# Altium footprint library 1.03-电容.PcbLib: 224 footprints (part 13 of 14)
Each footprint in its own frame and in the unit in brackets; x right, y up, seen from the top. Pads: shape width x height; smd on the part's side, far side on the other; paste and mask are expansions set on the pad; w line width, h text height; cw(c..) or ccw(c..) is an arc to the next point about the centre after c.
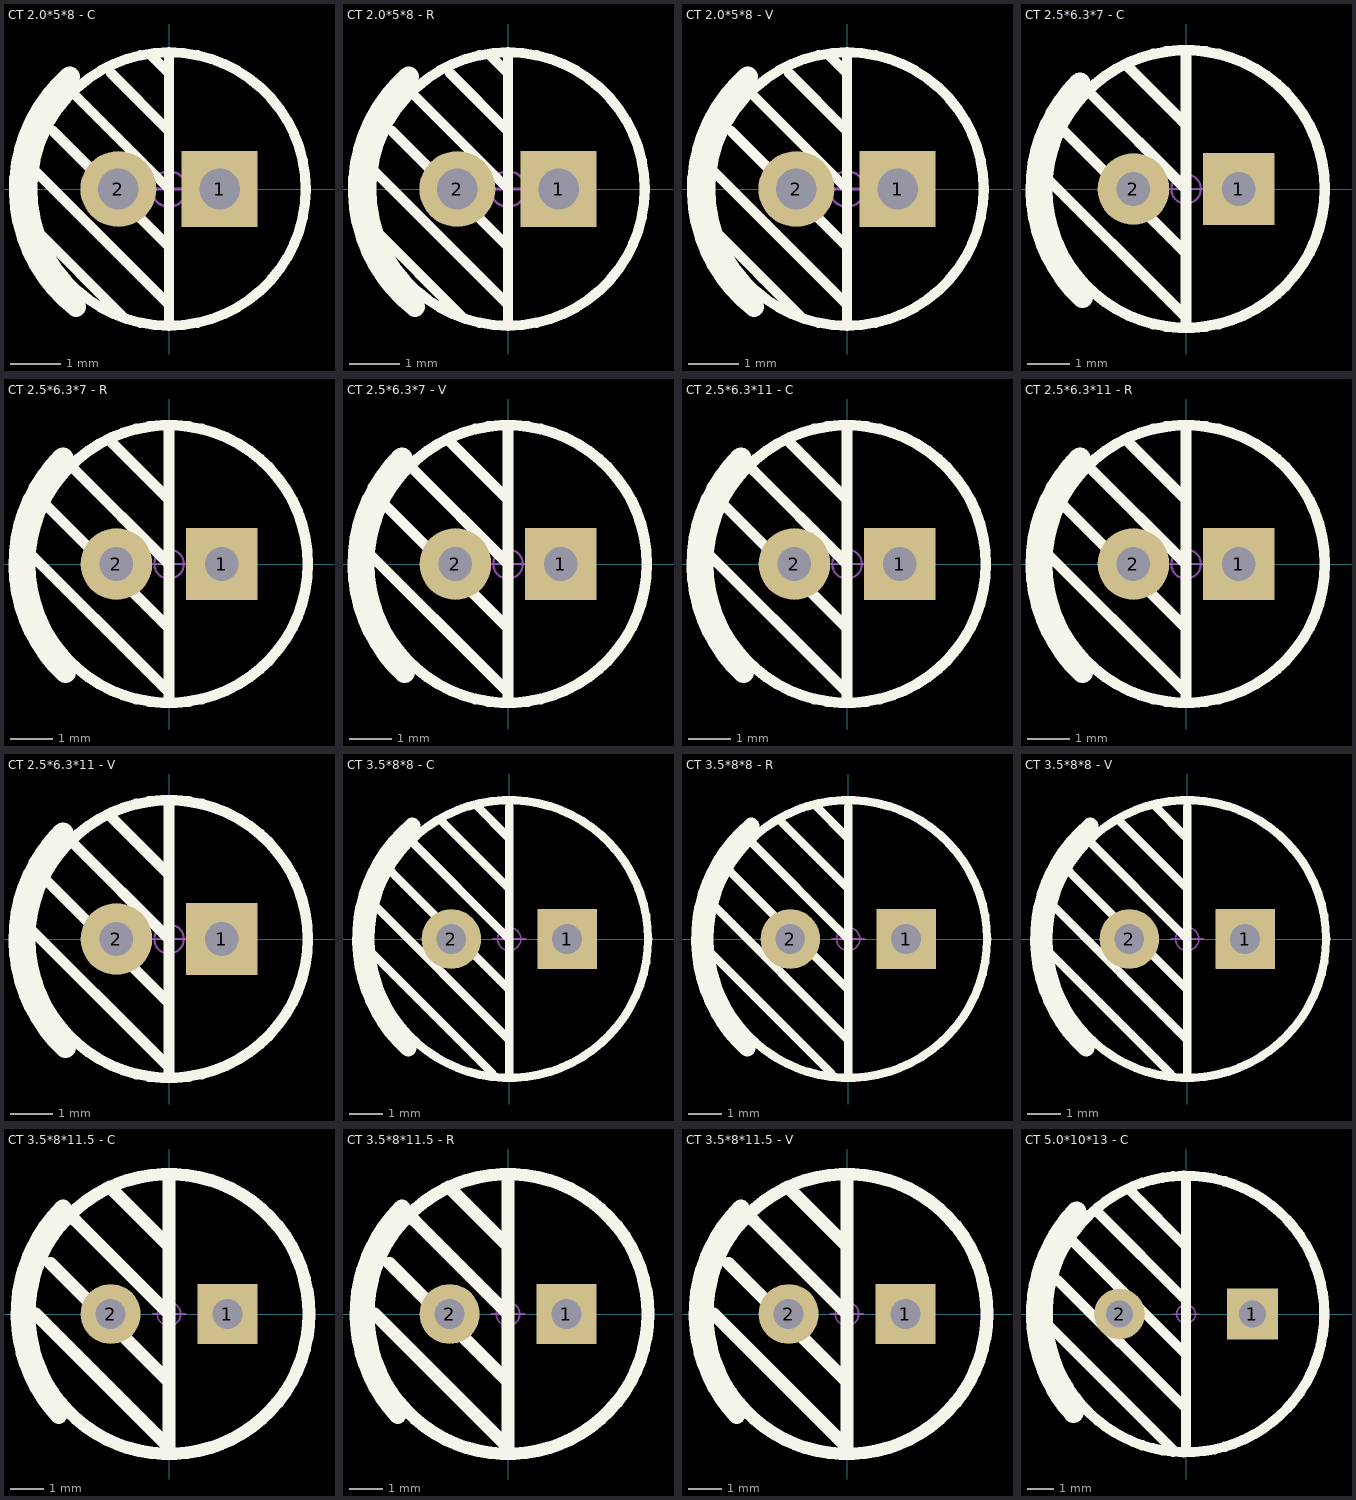
[diagram p12: the footprints below, top view; thin cyan lines are the x and y axes]

## CT 2.0*5*8 - C [mm] "脚距2mm , 直径5mm , 高8mm"
pads (2):
  rect 1.5x1.5 hole 0.8: 1(1,0)
  round 1.5 hole 0.8: 2(-1,0)
Top Overlay:
  circle w0.2: c0,0 r2.7
  lines w0.2: -2.667,-0.762 -0.889,-2.54 ; -2.667,0.381 0,-2.286 ; -2.286,1.143 0,-1.143 ; -1.905,1.905 0,0 ; -1.143,2.286 0,1.143 ; -0.381,2.667 0,2.286 ; 0,-2.667 0,2.667
  lines w0.4: -1.96,2.221 ccw(c0,0) -1.835,-2.325
Mechanical 15:
  circle w0.05: c0,0 r0.35
  lines w0.05: -0.5,0 0.5,0 ; 0,-0.5 0,0.5
3D body "CS_TH_5x8-B2.STEP": height 8.06, standoff -3.45, extent -2.5,-2.494 2.5,2.494

## CT 2.0*5*8 - R [mm] "脚距2mm , 直径5mm , 高8mm"
pads (2):
  rect 1.5x1.5 hole 0.8: 1(1,0)
  round 1.5 hole 0.8: 2(-1,0)
Top Overlay:
  circle w0.2: c0,0 r2.7
  lines w0.2: -2.667,-0.762 -0.889,-2.54 ; -2.667,0.381 0,-2.286 ; -2.286,1.143 0,-1.143 ; -1.905,1.905 0,0 ; -1.143,2.286 0,1.143 ; -0.381,2.667 0,2.286 ; 0,-2.667 0,2.667
  lines w0.4: -1.96,2.221 ccw(c0,0) -1.835,-2.325
Mechanical 15:
  circle w0.05: c0,0 r0.35
  lines w0.05: -0.5,0 0.5,0 ; 0,-0.5 0,0.5
3D body "CS_TH_5x8-R2.STEP": height 8.06, standoff -3.45, extent -2.5,-2.494 2.5,2.494

## CT 2.0*5*8 - V [mm] "脚距2mm , 直径5mm , 高8mm"
pads (2):
  rect 1.5x1.5 hole 0.8: 1(1,0)
  round 1.5 hole 0.8: 2(-1,0)
Top Overlay:
  circle w0.2: c0,0 r2.7
  lines w0.2: -2.667,-0.762 -0.889,-2.54 ; -2.667,0.381 0,-2.286 ; -2.286,1.143 0,-1.143 ; -1.905,1.905 0,0 ; -1.143,2.286 0,1.143 ; -0.381,2.667 0,2.286 ; 0,-2.667 0,2.667
  lines w0.4: -1.96,2.221 ccw(c0,0) -1.835,-2.325
Mechanical 15:
  circle w0.05: c0,0 r0.35
  lines w0.05: -0.5,0 0.5,0 ; 0,-0.5 0,0.5
3D body "CS_TH_5x8-V2.STEP": height 8.06, standoff -3.45, extent -2.5,-2.494 2.5,2.494

## CT 2.5*6.3*7 - C [mm] "脚距2.5mm , 直径6.3mm , 高7mm"
pads (2):
  rect 1.7x1.7 hole 0.8: 1(1.25,0)
  round 1.7 hole 0.8: 2(-1.25,0)
Top Overlay:
  circle w0.254: c0,0 r3.3
  lines w0.254: -3.556,0.508 0,-3.048 ; -3.048,1.524 0,-1.524 ; -2.286,2.286 0,0 ; -1.397,2.921 0,1.524 ; 0,-3.15 0,3.15
  lines w0.504: -2.521,2.521 ccw(c0,0) -2.459,-2.582
Mechanical 15:
  circle w0.05: c0,0 r0.35
  lines w0.05: -0.5,0 0.5,0 ; 0,-0.5 0,0.5
3D body "CS_TH_6_3x7-B2.STEP": height 7.05, standoff -3.45, extent -3.15,-3.144 3.15,3.145

## CT 2.5*6.3*7 - R [mm] "脚距2.5mm , 直径6.3mm , 高7mm"
pads (2):
  rect 1.7x1.7 hole 0.8: 1(1.25,0)
  round 1.7 hole 0.8: 2(-1.25,0)
Top Overlay:
  circle w0.254: c0,0 r3.3
  lines w0.254: -3.556,0.508 0,-3.048 ; -3.048,1.524 0,-1.524 ; -2.286,2.286 0,0 ; -1.397,2.921 0,1.524 ; 0,-3.15 0,3.15
  lines w0.504: -2.521,2.521 ccw(c0,0) -2.459,-2.582
Mechanical 15:
  circle w0.05: c0,0 r0.35
  lines w0.05: -0.5,0 0.5,0 ; 0,-0.5 0,0.5
3D body "CS_TH_6_3x7-R2.STEP": height 7.05, standoff -3.45, extent -3.15,-3.144 3.15,3.145

## CT 2.5*6.3*7 - V [mm] "脚距2.5mm , 直径6.3mm , 高7mm"
pads (2):
  rect 1.7x1.7 hole 0.8: 1(1.25,0)
  round 1.7 hole 0.8: 2(-1.25,0)
Top Overlay:
  circle w0.254: c0,0 r3.3
  lines w0.254: -3.556,0.508 0,-3.048 ; -3.048,1.524 0,-1.524 ; -2.286,2.286 0,0 ; -1.397,2.921 0,1.524 ; 0,-3.15 0,3.15
  lines w0.504: -2.521,2.521 ccw(c0,0) -2.459,-2.582
Mechanical 15:
  circle w0.05: c0,0 r0.35
  lines w0.05: -0.5,0 0.5,0 ; 0,-0.5 0,0.5
3D body "CS_TH_6_3x7-V2.STEP": height 7.05, standoff -3.45, extent -3.15,-3.144 3.15,3.145

## CT 2.5*6.3*11 - C [mm] "脚距2.5mm , 直径6.3mm , 高11mm"
pads (2):
  rect 1.7x1.7 hole 0.8: 1(1.25,0)
  round 1.7 hole 0.8: 2(-1.25,0)
Top Overlay:
  circle w0.254: c0,0 r3.3
  lines w0.254: -3.556,0.508 0,-3.048 ; -3.048,1.524 0,-1.524 ; -2.286,2.286 0,0 ; -1.397,2.921 0,1.524 ; 0,-3.15 0,3.15
  lines w0.504: -2.521,2.521 ccw(c0,0) -2.459,-2.582
Mechanical 15:
  circle w0.05: c0,0 r0.35
  lines w0.05: -0.5,0 0.5,0 ; 0,-0.5 0,0.5
3D body "CS_TH_6_3x11-B2.STEP": height 11.05, standoff -3.45, extent -3.15,-3.143 3.15,3.143

## CT 2.5*6.3*11 - R [mm] "脚距2.5mm , 直径6.3mm , 高11mm"
pads (2):
  rect 1.7x1.7 hole 0.8: 1(1.25,0)
  round 1.7 hole 0.8: 2(-1.25,0)
Top Overlay:
  circle w0.254: c0,0 r3.3
  lines w0.254: -3.556,0.508 0,-3.048 ; -3.048,1.524 0,-1.524 ; -2.286,2.286 0,0 ; -1.397,2.921 0,1.524 ; 0,-3.15 0,3.15
  lines w0.504: -2.521,2.521 ccw(c0,0) -2.459,-2.582
Mechanical 15:
  circle w0.05: c0,0 r0.35
  lines w0.05: -0.5,0 0.5,0 ; 0,-0.5 0,0.5
3D body "CS_TH_6_3x11-R2.STEP": height 11.05, standoff -3.45, extent -3.15,-3.143 3.15,3.143

## CT 2.5*6.3*11 - V [mm] "脚距2.5mm , 直径6.3mm , 高11mm"
pads (2):
  rect 1.7x1.7 hole 0.8: 1(1.25,0)
  round 1.7 hole 0.8: 2(-1.25,0)
Top Overlay:
  circle w0.254: c0,0 r3.3
  lines w0.254: -3.556,0.508 0,-3.048 ; -3.048,1.524 0,-1.524 ; -2.286,2.286 0,0 ; -1.397,2.921 0,1.524 ; 0,-3.15 0,3.15
  lines w0.504: -2.521,2.521 ccw(c0,0) -2.459,-2.582
Mechanical 15:
  circle w0.05: c0,0 r0.35
  lines w0.05: -0.5,0 0.5,0 ; 0,-0.5 0,0.5
3D body "CS_TH_6_3x11-V2.STEP": height 11.05, standoff -3.45, extent -3.15,-3.143 3.15,3.143

## CT 3.5*8*8 - C [mm] "脚距3.5mm , 直径8mm , 高8mm"
pads (2):
  rect 1.8x1.8 hole 0.9: 1(1.75,0)
  round 1.8 hole 0.9: 2(-1.75,0)
Top Overlay:
  circle w0.254: c0,0 r4.2
  lines w0.254: -4.572,0 -0.508,-4.064 ; -4.064,1.016 0,-3.048 ; -3.556,2.032 0,-1.524 ; -3.048,3.048 0,0 ; -2.032,3.556 0,1.524 ; -1.016,4.064 0,3.048 ; 0,-4.191 0,4
  lines w0.504: -3.053,-3.307 cw(c0,0) -2.929,3.417
Mechanical 15:
  circle w0.05: c0,0 r0.35
  lines w0.05: -0.5,0 0.5,0 ; 0,-0.5 0,0.5
3D body "CS_TH_8x8-B2.STEP": height 8.05, standoff -3.45, extent -4,-3.994 4,3.994

## CT 3.5*8*8 - R [mm] "脚距3.5mm , 直径8mm , 高8mm               联系卖家 免费查找封装"
pads (2):
  rect 1.8x1.8 hole 0.9: 1(1.75,0)
  round 1.8 hole 0.9: 2(-1.75,0)
Top Overlay:
  circle w0.254: c0,0 r4.2
  lines w0.254: -4.572,0 -0.508,-4.064 ; -4.064,1.016 0,-3.048 ; -3.556,2.032 0,-1.524 ; -3.048,3.048 0,0 ; -2.032,3.556 0,1.524 ; -1.016,4.064 0,3.048 ; 0,-4.191 0,4
  lines w0.504: -3.053,-3.307 cw(c0,0) -2.929,3.417
Mechanical 15:
  circle w0.05: c0,0 r0.35
  lines w0.05: -0.5,0 0.5,0 ; 0,-0.5 0,0.5
3D body "CS_TH_8x8-R2.STEP": height 8.05, standoff -3.45, extent -4,-3.994 4,3.994

## CT 3.5*8*8 - V [mm] "脚距3.5mm , 直径8mm , 高8mm"
pads (2):
  rect 1.8x1.8 hole 0.9: 1(1.75,0)
  round 1.8 hole 0.9: 2(-1.75,0)
Top Overlay:
  circle w0.254: c0,0 r4.2
  lines w0.254: -4.572,0 -0.508,-4.064 ; -4.064,1.016 0,-3.048 ; -3.556,2.032 0,-1.524 ; -3.048,3.048 0,0 ; -2.032,3.556 0,1.524 ; -1.016,4.064 0,3.048 ; 0,-4.191 0,4
  lines w0.504: -3.053,-3.307 cw(c0,0) -2.929,3.417
Mechanical 15:
  circle w0.05: c0,0 r0.35
  lines w0.05: -0.5,0 0.5,0 ; 0,-0.5 0,0.5
3D body "CS_TH_8x8-V2.STEP": height 8.05, standoff -3.45, extent -4,-3.994 4,3.994

## CT 3.5*8*11.5 - C [mm] "脚距3.5mm , 直径8mm , 高11.5mm"
pads (2):
  rect 1.8x1.8 hole 0.9: 1(1.75,0)
  round 1.8 hole 0.9: 2(-1.75,0)
Top Overlay:
  circle w0.381: c0,0 r4.2
  lines w0.381: -4,0 0,-4 0,4 ; -3.556,1.524 0,-2.032 ; -2.807,2.807 0,0 ; -1.778,3.81 0,2.032
  lines w0.504: -3.307,-3.053 cw(c0,0) -3.183,3.183
Mechanical 15:
  circle w0.05: c0,0 r0.35
  lines w0.05: -0.5,0 0.5,0 ; 0,-0.5 0,0.5
3D body "CS_TH_8x11_5-B2.STEP": height 11.55, standoff -3.45, extent -4,-3.993 4,3.993

## CT 3.5*8*11.5 - R [mm] "脚距3.5mm , 直径8mm , 高11.5mm"
pads (2):
  rect 1.8x1.8 hole 0.9: 1(1.75,0)
  round 1.8 hole 0.9: 2(-1.75,0)
Top Overlay:
  circle w0.381: c0,0 r4.2
  lines w0.381: -4,0 0,-4 0,4 ; -3.556,1.524 0,-2.032 ; -2.807,2.807 0,0 ; -1.778,3.81 0,2.032
  lines w0.504: -3.307,-3.053 cw(c0,0) -3.183,3.183
Mechanical 15:
  circle w0.05: c0,0 r0.35
  lines w0.05: -0.5,0 0.5,0 ; 0,-0.5 0,0.5
3D body "CS_TH_8x11_5-R2.STEP": height 11.55, standoff -3.45, extent -4,-3.993 4,3.993

## CT 3.5*8*11.5 - V [mm] "脚距3.5mm , 直径8mm , 高11.5mm"
pads (2):
  rect 1.8x1.8 hole 0.9: 1(1.75,0)
  round 1.8 hole 0.9: 2(-1.75,0)
Top Overlay:
  circle w0.381: c0,0 r4.2
  lines w0.381: -4,0 0,-4 0,4 ; -3.556,1.524 0,-2.032 ; -2.807,2.807 0,0 ; -1.778,3.81 0,2.032
  lines w0.504: -3.307,-3.053 cw(c0,0) -3.183,3.183
Mechanical 15:
  circle w0.05: c0,0 r0.35
  lines w0.05: -0.5,0 0.5,0 ; 0,-0.5 0,0.5
3D body "CS_TH_8x11_5-V2.STEP": height 11.55, standoff -3.45, extent -4,-3.993 4,3.993

## CT 5.0*10*13 - C [mm] "脚距5mm , 直径10mm , 高13mm               联系卖家 免费查找封装"
pads (2):
  rect 1.9x1.9 hole 1: 1(2.5,0)
  round 1.9 hole 1: 2(-2.5,0)
Top Overlay:
  circle w0.381: c0,0 r5.2
  lines w0.381: -5.08,-0.508 -0.508,-5.08 ; -5.08,1.27 -4.826,1.27 0,-3.556 ; -4.318,2.794 0,-1.524 ; -3.302,3.81 0,0.508 0,1.016 ; -2.032,4.572 0,2.54 ; 0,-5 0,5
  lines w0.75: -4.229,-3.731 cw(c0,0) -4.114,3.857
Mechanical 15:
  circle w0.05: c0,0 r0.35
  lines w0.05: -0.5,0 0.5,0 ; 0,-0.5 0,0.5
3D body "CS_TH_10x13-B.STEP": height 13.13, standoff -3.37, extent -5,-5 5,5